# Altium footprint library Standard2.PcbLib: 423 footprints (part 7 of 27)
Each footprint in its own frame and in the unit in brackets; x right, y up, seen from the top. Pads: shape width x height; smd on the part's side, far side on the other; paste and mask are expansions set on the pad; w line width, h text height; cw(c..) or ccw(c..) is an arc to the next point about the centre after c.
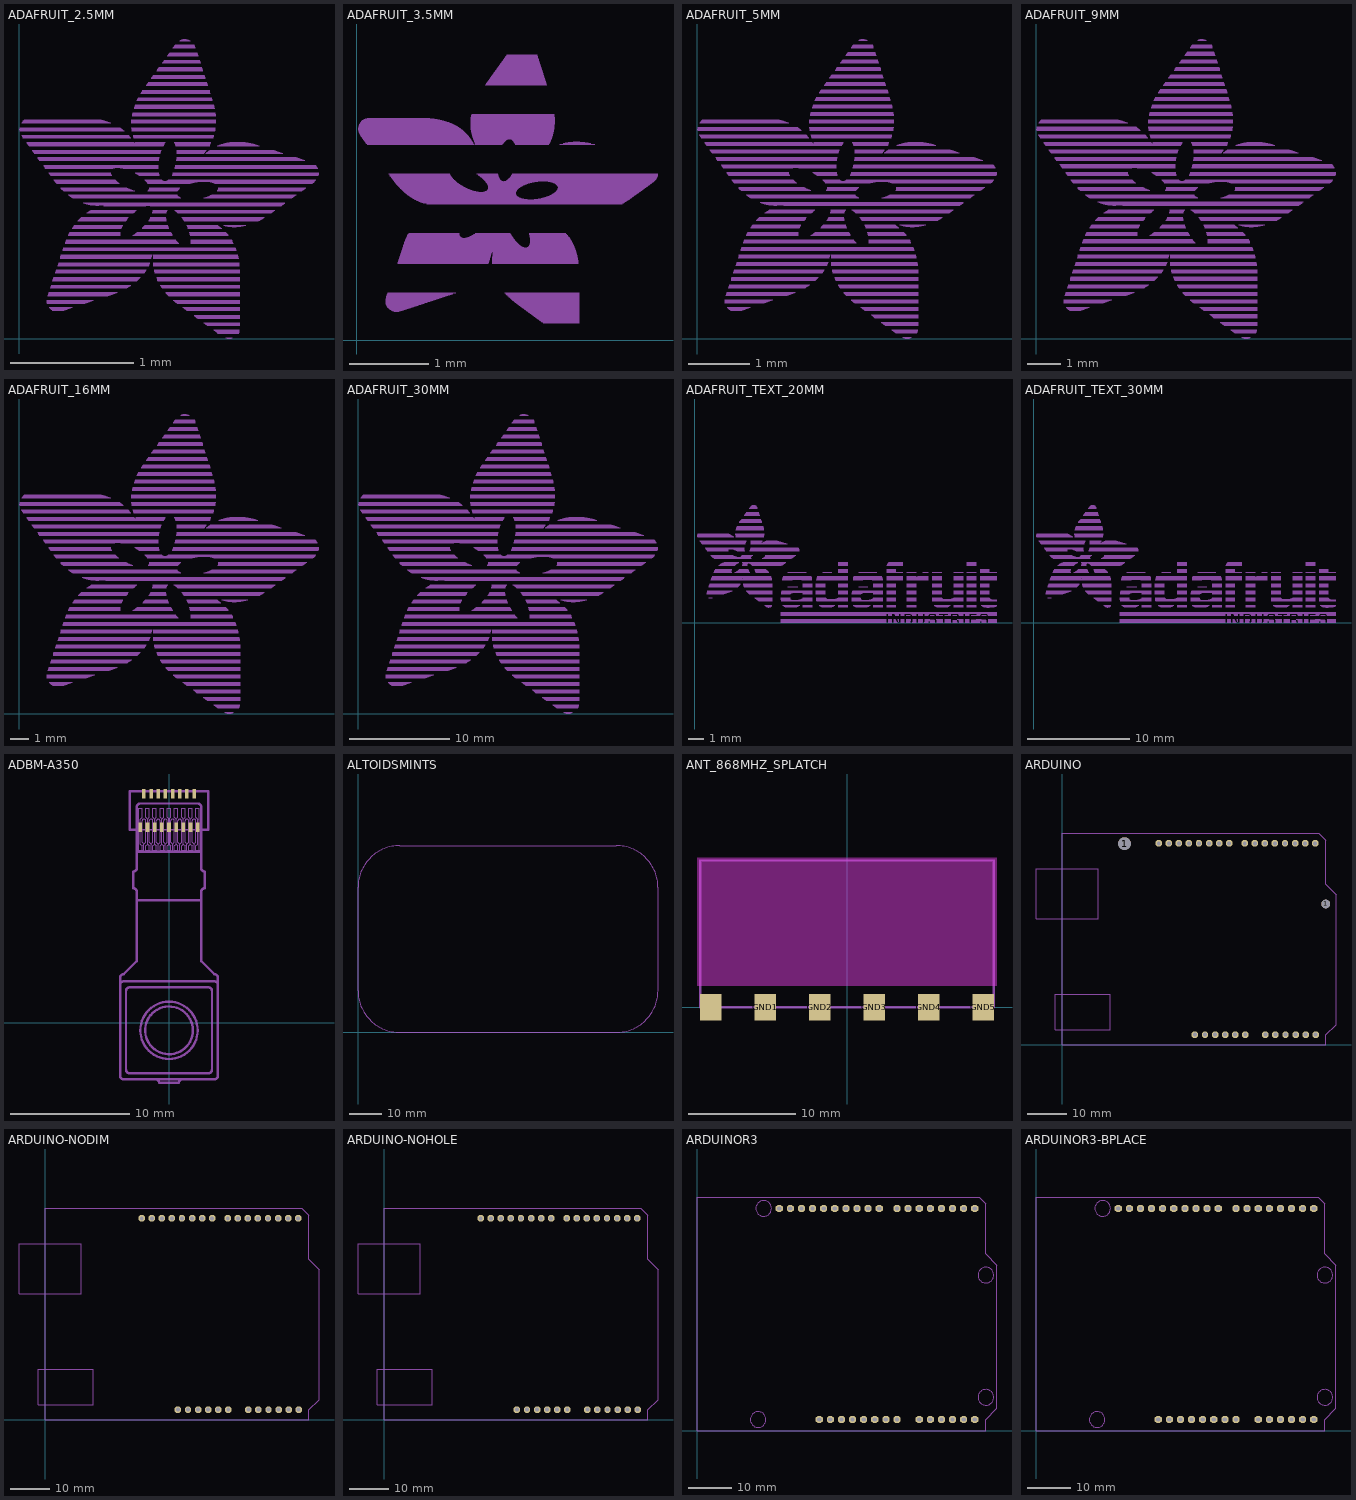
[diagram p6: the footprints below, top view; thin cyan lines are the x and y axes]

## ADAFRUIT_2.5MM [mm]
Mechanical 2:
  drawing of 1191 lines, arcs and shapes, not listed

## ADAFRUIT_3.5MM [mm]
Mechanical 2:
  drawing of 1122 lines, arcs and shapes, not listed

## ADAFRUIT_5MM [mm]
Mechanical 2:
  drawing of 1191 lines, arcs and shapes, not listed

## ADAFRUIT_9MM [mm]
Mechanical 2:
  drawing of 1191 lines, arcs and shapes, not listed

## ADAFRUIT_16MM [mm]
Mechanical 2:
  drawing of 1191 lines, arcs and shapes, not listed

## ADAFRUIT_30MM [mm]
Mechanical 2:
  drawing of 1191 lines, arcs and shapes, not listed

## ADAFRUIT_TEXT_20MM [mm]
Mechanical 2:
  drawing of 2896 lines, arcs and shapes, not listed

## ADAFRUIT_TEXT_30MM [mm]
Mechanical 2:
  drawing of 2896 lines, arcs and shapes, not listed

## ADBM-A350 [mil]
pads (17):
  rect 11.81x31.5 smd: 1(-94.49,644.88) 2(-82.68,755.12) 3(-70.87,644.88) 4(-59.06,755.12) 5(-47.24,644.88) 6(-35.43,755.12) 7(-23.62,644.88) 8(-11.81,755.12) 9(0,644.88) 10(11.81,755.12) 11(23.62,644.88) 12(35.43,755.12) 13(47.24,644.88) 14(59.06,755.12) 15(70.87,644.88) 16(82.68,755.12) 17(94.49,644.88)
Mechanical 2:
  lines w8: -108.27,637.01 -129.92,637.01 -129.92,762.99 -94.49,762.99 ; 94.49,762.99 129.92,762.99 129.92,637.01 108.27,637.01 ; -161.42,-174.61 ccw(c-149.61,-174.61) -149.61,-186.42 -51.18,-186.42 cw(c-47.24,-202.16) -31.5,-198.23 31.5,-198.23 cw(c47.24,-202.16) 51.18,-186.42 149.61,-186.42 ccw(c149.61,-174.61) 161.42,-174.61 161.42,148.23 ccw(c149.61,148.23) 149.61,160.04 106.3,203.35 106.3,431.69 cw(c118.11,431.69) 118.11,443.5 118.11,498.62 cw(c118.11,510.43) 106.3,510.43 106.3,709.25 ccw(c94.49,711.22) 96.46,723.03 -96.46,723.03 ccw(c-94.49,711.22) -106.3,709.25 -106.3,510.43 cw(c-118.11,510.43) -118.11,498.62 -118.11,443.5 cw(c-118.11,431.69) -106.3,431.69 -106.3,203.35 -149.61,160.04 ccw(c-149.61,148.23) -161.42,148.23 -161.42,-174.61
Mechanical 18:
  drawing of 193 lines, arcs and shapes, not listed

## ALTOIDSMINTS [mm]
Mechanical 2:
  lines w0.203: 0,12.7 ccw(c12.7,12.7) 12.7,0 78.74,0 ccw(c78.74,12.7) 91.44,12.7 91.44,44.196 ccw(c78.738,44.198) 78.74,56.9 12.7,56.9 ccw(c12.702,44.198) 0,44.196 0,12.7

## ANT_868MHZ_SPLATCH [mm]
pads (6):
  rect 2x2.5 smd: GND1(-7.62,0) GND2(-2.54,0) GND3(2.54,0) GND4(7.62,0) GND5(12.7,0) MICROSTRIP(-12.7,0)
Keep-Out Layer:
  rectangle: -14,2 14,14
  rectangle: -14,2 14,14
Mechanical 18:
  lines w0.203: -13.7,0 -13.7,13.7 13.7,13.7 13.7,0 -13.7,0

## ARDUINO [mm]
pads (30):
  round 3.2 hole 3.2: 1(15.758,50.754)
  round 2.2 hole 2.2: 1(66.558,35.514)
  oct 1.623x1.623 hole 1: 3V(36.068,2.54) 5V(38.608,2.54) A0(51.308,2.54) A1(53.848,2.54) A2(56.388,2.54) A3(58.928,2.54) A4(61.468,2.54) A5(64.008,2.54) AREF(24.384,50.8) D0(63.881,50.8) D1(61.341,50.8) D2(58.801,50.8) D3(56.261,50.8) D4(53.721,50.8) D5(51.181,50.8) D6(48.641,50.8) D7(46.101,50.8) D8(42.164,50.8) D9(39.624,50.8) D10(37.084,50.8) D11(34.544,50.8) D12(32.004,50.8) D13(29.464,50.8) GND(26.924,50.8) GND1(43.688,2.54) GND2(41.148,2.54) RESET(33.528,2.54) VIN(46.228,2.54)
Mechanical 1:
  lines w0: 66.548,2.489 66.548,0 0,0 0,31.75 0,53.34 64.846,53.34 66.548,51.638 66.548,40.488 69.139,37.897 69.139,5.055 66.573,2.489
Mechanical 2:
  lines w0: 66.548,2.489 66.573,2.489
Mechanical 19:
  lines w0: -6.604,31.75 0,31.75 9.144,31.75 9.144,44.45 -6.604,44.45 -6.604,31.75 ; -1.778,3.81 -1.778,12.7 12.192,12.7 12.192,3.81 -1.778,3.81

## ARDUINO-NODIM [mm]
pads (28):
  oct 1.623x1.623 hole 1: 3V(36.068,2.54) 5V(38.608,2.54) A0(51.308,2.54) A1(53.848,2.54) A2(56.388,2.54) A3(58.928,2.54) A4(61.468,2.54) A5(64.008,2.54) AREF(24.384,50.8) D0(63.881,50.8) D1(61.341,50.8) D2(58.801,50.8) D3(56.261,50.8) D4(53.721,50.8) D5(51.181,50.8) D6(48.641,50.8) D7(46.101,50.8) D8(42.164,50.8) D9(39.624,50.8) D10(37.084,50.8) D11(34.544,50.8) D12(32.004,50.8) D13(29.464,50.8) GND(26.924,50.8) GND1(43.688,2.54) GND2(41.148,2.54) RESET(33.528,2.54) VIN(46.228,2.54)
Mechanical 2:
  lines w0: 66.548,2.489 66.573,2.489
Mechanical 3:
  lines w0: 66.548,2.489 66.548,0 0,0 0,53.34 64.846,53.34 66.548,51.638 66.548,40.488 69.139,37.897 69.139,5.055 66.573,2.489
Mechanical 19:
  lines w0: -6.604,31.75 -6.604,44.45 9.144,44.45 9.144,31.75 -6.604,31.75 ; -1.778,3.81 12.192,3.81 12.192,12.7 -1.778,12.7 -1.778,3.81

## ARDUINO-NOHOLE [mm]
pads (28):
  oct 1.623x1.623 hole 1: 3V(36.068,2.54) 5V(38.608,2.54) A0(51.308,2.54) A1(53.848,2.54) A2(56.388,2.54) A3(58.928,2.54) A4(61.468,2.54) A5(64.008,2.54) AREF(24.384,50.8) D0(63.881,50.8) D1(61.341,50.8) D2(58.801,50.8) D3(56.261,50.8) D4(53.721,50.8) D5(51.181,50.8) D6(48.641,50.8) D7(46.101,50.8) D8(42.164,50.8) D9(39.624,50.8) D10(37.084,50.8) D11(34.544,50.8) D12(32.004,50.8) D13(29.464,50.8) GND(26.924,50.8) GND1(43.688,2.54) GND2(41.148,2.54) RESET(33.528,2.54) VIN(46.228,2.54)
Mechanical 1:
  lines w0: 66.548,2.489 66.548,0 0,0 0,31.75 0,53.34 64.846,53.34 66.548,51.638 66.548,40.488 69.139,37.897 69.139,5.055 66.573,2.489
Mechanical 2:
  lines w0: 66.548,2.489 66.573,2.489
Mechanical 19:
  lines w0: -6.604,31.75 -6.604,44.45 9.144,44.45 9.144,31.75 0,31.75 -6.604,31.75 ; -1.778,3.81 12.192,3.81 12.192,12.7 -1.778,12.7 -1.778,3.81

## ARDUINOR3 [mm]
pads (32):
  oct 1.623x1.623 hole 1: 3V(35.56,2.54) 5V(38.1,2.54) A0(50.8,2.54) A1(53.34,2.54) A2(55.88,2.54) A3(58.42,2.54) A4(60.96,2.54) A5(63.5,2.54) AREF(23.876,50.8) D0(63.5,50.8) D1(60.96,50.8) D2(58.42,50.8) D3(55.88,50.8) D4(53.34,50.8) D5(50.8,50.8) D6(48.26,50.8) D7(45.72,50.8) D8(41.656,50.8) D9(39.116,50.8) D10(36.576,50.8) D11(34.036,50.8) D12(31.496,50.8) D13(28.956,50.8) GND(26.416,50.8) GND1(43.18,2.54) GND2(40.64,2.54) IOREF(30.48,2.54) RESERVED(27.94,2.54) RESET(33.02,2.54) SCL(18.796,50.8) SDA(21.336,50.8) VIN(45.72,2.54)
Mechanical 1:
  lines w0: 0,0 0,53.34 ; 64.516,53.34 66.04,51.816 66.04,40.386 68.58,37.846 ; 66.04,0 66.04,2.54 68.58,5.08
  lines w0.203: 0,0 66.04,0 ; 0,53.34 64.516,53.34 ; 68.58,5.08 68.58,37.846
Mechanical 18:
  circle w0.203: c66.04,7.62 r1.796
  circle w0.203: c66.04,35.56 r1.796
  circle w0.203: c13.97,2.54 r1.796
  circle w0.203: c15.24,50.8 r1.796

## ARDUINOR3-BPLACE [mm]
pads (32):
  oct 1.623x1.623 hole 1: 3V(35.56,2.54) 5V(38.1,2.54) A0(50.8,2.54) A1(53.34,2.54) A2(55.88,2.54) A3(58.42,2.54) A4(60.96,2.54) A5(63.5,2.54) AREF(23.876,50.8) D0(63.5,50.8) D1(60.96,50.8) D2(58.42,50.8) D3(55.88,50.8) D4(53.34,50.8) D5(50.8,50.8) D6(48.26,50.8) D7(45.72,50.8) D8(41.656,50.8) D9(39.116,50.8) D10(36.576,50.8) D11(34.036,50.8) D12(31.496,50.8) D13(28.956,50.8) GND(26.416,50.8) GND1(43.18,2.54) GND2(40.64,2.54) IOREF(30.48,2.54) RESERVED(27.94,2.54) RESET(33.02,2.54) SCL(18.796,50.8) SDA(21.336,50.8) VIN(45.72,2.54)
Mechanical 3:
  lines w0: 0,0 66.04,0 66.04,2.54 68.58,5.08 68.58,37.846 66.04,40.386 66.04,51.816 64.516,53.34 0,53.34 0,0
Mechanical 18:
  circle w0.203: c15.24,50.8 r1.796
  circle w0.203: c13.97,2.54 r1.796
  circle w0.203: c66.04,35.56 r1.796
  circle w0.203: c66.04,7.62 r1.796